# Altium footprint library Misc.PcbLib: 159 footprints (part 3 of 10)
Each footprint in its own frame and in the unit in brackets; x right, y up, seen from the top. Pads: shape width x height; smd on the part's side, far side on the other; paste and mask are expansions set on the pad; w line width, h text height; cw(c..) or ccw(c..) is an arc to the next point about the centre after c.
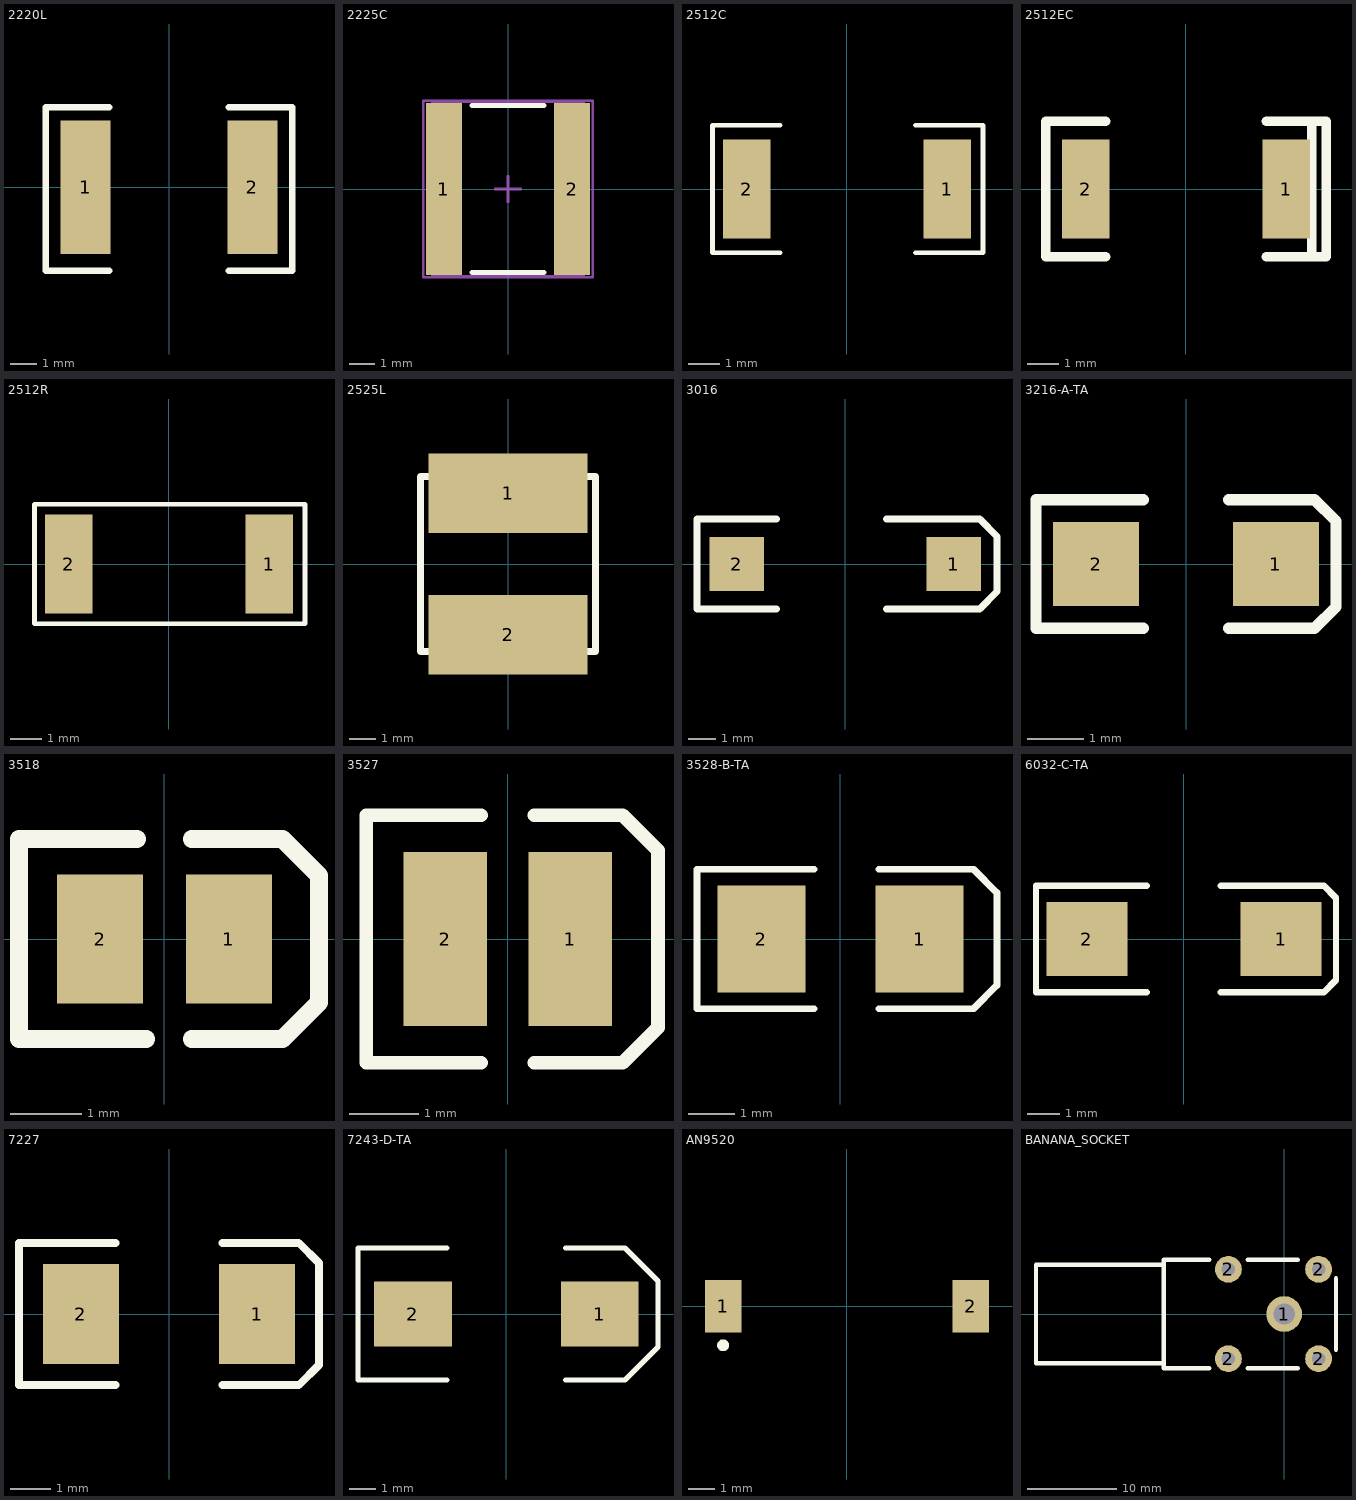
[diagram p2: the footprints below, top view; thin cyan lines are the x and y axes]

## 2220L [mm]
pads (2):
  rect 1.905x5.08 smd: 1(-3.175,0) 2(3.175,0)
Top Overlay:
  lines w0.254: -2.286,-3.175 -4.699,-3.175 -4.699,3.048 -2.286,3.048 ; 2.286,-3.175 4.699,-3.175 4.699,3.048 2.286,3.048
3D body "L2220.STEP": height 2.5, standoff 0, extent -2.875,-2.489 2.825,2.511

## 2225C [mm] "Chip Capacitor, Body 5.7x6.4mm, IPC High Density"
height 1.4
pads (2):
  rect 1.4x6.7 smd: 1(-2.5,0) 2(2.5,0)
Top Overlay:
  lines w0.2: -1.4,-3.25 1.4,-3.25 ; -1.4,3.25 1.4,3.25
Mechanical 13:
  lines w0.1: -2.95,-3.4 -2.95,3.4 2.95,3.4 2.95,-3.4 -2.95,-3.4
Mechanical 15:
  lines w0.1: -0.5,0 0.5,0 ; 0,-0.5 0,0.5 ; -3.3,-3.45 -3.3,3.45 3.3,3.45 3.3,-3.45 -3.3,-3.45
3D body "User Library-SMD CAPACITOR.STEP": height 1, standoff 0, extent -2.8,-3.023 2.8,3.277

## 2512C [mm]
pads (2):
  rect 1.524x3.175 smd: 1(3.2,0) 2(-3.2,0)
Top Overlay:
  lines w0.152: -2.134,-2.032 -4.293,-2.032 -4.293,2.032 -2.134,2.032 ; 2.184,-2.032 4.343,-2.032 4.343,2.032 2.184,2.032
3D body "User Library-2512 SMD Resistor.step": height 1.6, standoff 0, extent -3.231,-1.5 3.119,1.5

## 2512EC [mm]
pads (2):
  rect 1.524x3.175 smd: 1(3.2,0) 2(-3.2,0)
Top Overlay:
  lines w0.3: -2.565,-2.159 -4.47,-2.159 -4.47,2.159 -2.565,2.159 ; 2.565,-2.159 4.47,-2.159 4.47,2.159 2.565,2.159 ; 4.012,-2.151 4.012,2.159
3D body "User Library-EL_SMD_E.step": height -0.44, standoff -4.46, extent -3.65,-2.15 3.65,2.15

## 2512R [mm]
pads (2):
  rect 1.524x3.175 smd: 1(3.2,0) 2(-3.2,0)
Top Overlay:
  lines w0.152: -4.293,-1.905 -4.293,1.905 4.343,1.905 4.343,-1.905 -4.293,-1.905
3D body "User Library-res2512.STEP": height 0.64, standoff 0, extent -3.4,-1.65 3.4,1.65

## 2525L [mm]
pads (2):
  rect 6x3 smd: 1(0,2.667) 2(0,-2.667)
Top Overlay:
  lines w0.254: -3.302,-3.302 3.302,-3.302 3.302,3.302 -3.302,3.302 -3.302,-3.302
3D body "µç¸Ð.STEP": height 4.5, standoff -0.01, extent -2.6,-2.832 2.6,2.882

## 3016 [mm]
pads (2):
  rect 2x2 smd: 1(4,0) 2(-4,0)
Top Overlay:
  lines w0.254: -2.54,-1.651 -5.461,-1.651 -5.461,1.651 -2.54,1.651 ; 1.524,-1.651 4.953,-1.651 5.588,-1.016 5.588,1.016 ; 1.524,1.651 4.953,1.651 5.588,1.016 ; 5.08,1.524 5.588,1.016

## 3216-A-TA [mm]
pads (2):
  rect 1.524x1.5 smd: 1(1.6,0) 2(-1.6,0)
Top Overlay:
  lines w0.2: -0.762,-1.143 -2.667,-1.143 -2.667,1.143 -0.762,1.143 ; 0.762,-1.143 2.286,-1.143 2.667,-0.762 2.667,0.762 2.286,1.143 0.762,1.143
3D body "User Library-AVX_ACASE.STEP": height 1.71, standoff 0, extent -1.7,-0.84 1.7,0.84

## 3518 [mm]
pads (2):
  rect 1.2x1.8 smd: 1(0.9,0) 2(-0.9,0)
Top Overlay:
  lines w0.25: -0.381,1.397 -2.032,1.397 -2.032,-1.397 -0.254,-1.397 ; 0.381,-1.397 1.651,-1.397 2.159,-0.889 2.159,0.889 1.651,1.397 0.381,1.397

## 3527 [mm]
pads (2):
  rect 1.2x2.5 smd: 1(0.9,0) 2(-0.9,0)
Top Overlay:
  lines w0.2: -0.381,-1.778 -2.032,-1.778 -2.032,1.778 -0.381,1.778 ; 0.381,-1.778 1.651,-1.778 2.159,-1.27 2.159,1.27 1.651,1.778 0.381,1.778

## 3528-B-TA [mm]
pads (2):
  rect 1.9x2.3 smd: 1(1.7,0) 2(-1.7,0)
Top Overlay:
  lines w0.15: -0.572,-1.5 -3.085,-1.5 -3.085,1.5 -0.572,1.5 ; 0.826,-1.5 2.857,-1.5 3.365,-0.992 ; 0.826,1.5 2.857,1.5 3.365,0.992 ; 3.365,-1 3.365,1
3D body "User Library-CaseB_3528-21.STEP": height 1.9, standoff 0, extent -1.75,-1.397 1.75,1.403

## 6032-C-TA [mm]
pads (2):
  rect 2.5x2.3 smd: 1(3,0) 2(-3,0)
Top Overlay:
  lines w0.2: -1.143,-1.651 -4.572,-1.651 -4.572,1.651 -1.143,1.651 ; 1.143,-1.651 4.318,-1.651 4.699,-1.27 4.699,1.27 4.318,1.651 1.143,1.651
3D body "User Library-CAP_TANT_6032-28_y.STEP": height 2.8, standoff 0, extent -3.15,-1.75 3.15,1.75

## 7227 [mm]
pads (2):
  rect 1.9x2.5 smd: 1(2.2,0) 2(-2.2,0)
Top Overlay:
  lines w0.2: -1.333,-1.778 -3.746,-1.778 -3.746,1.778 -1.333,1.778 ; 1.333,-1.778 3.238,-1.778 3.746,-1.27 3.746,1.27 3.238,1.778 1.333,1.778

## 7243-D-TA [mm]
pads (2):
  rect 3x2.5 smd: 1(3.6,0) 2(-3.6,0)
Top Overlay:
  lines w0.2: -2.286,-2.54 -5.715,-2.54 -5.715,2.54 -2.286,2.54 ; 2.286,-2.54 4.572,-2.54 5.842,-1.27 5.842,1.27 4.572,2.54 2.286,2.54
3D body "User Library-CAP_TANT_7343-40.STEP": height 4, standoff 0, extent -3.8,-2.3 3.8,2.3

## AN9520 [mm] "Multilayer Chip Antenna for 2.4GHz Wireless Communication"
height 1
pads (2):
  rect 1.4x2 smd: 1(-4.75,0) 2(4.75,0)
Top Overlay:
  circle w0.254: c-4.75,-1.5 r0.1
3D body: height 1.34, standoff 0, extent -4.75,-1.05 -4.1,1.05
3D body: height 1.34, standoff 0, extent 4.1,-1.05 4.75,1.05
3D body: height 1.34, standoff 0, extent -4.1,-1.05 4.1,1.05

## BANANA_SOCKET [mm]
pads (5):
  round 4 hole 2.4: 1(0,0)
  round 3 hole 1.5: 2(-6.25,-5) 2(-6.25,5) 2(3.85,-5) 2(3.85,5)
Top Overlay:
  lines w0.5: -13.5,-5.5 -27.8,-5.5 -27.8,5.5 -13.5,5.5 ; -8.4,-6.1 -13.5,-6.1 -13.5,6.1 -8.4,6.1 ; -4.1,-6.1 1.5,-6.1 ; -4.1,6.1 1.5,6.1 ; 5.8,-4 5.8,4
3D body: height 12.2, standoff 0.7, extent -13.5,-6.1 5.8,6.1